# Altium footprint library ESKDPcbLib.PcbLib: 608 footprints (part 4 of 38)
Each footprint in its own frame and in the unit in brackets; x right, y up, seen from the top. Pads: shape width x height; smd on the part's side, far side on the other; paste and mask are expansions set on the pad; w line width, h text height; cw(c..) or ccw(c..) is an arc to the next point about the centre after c.
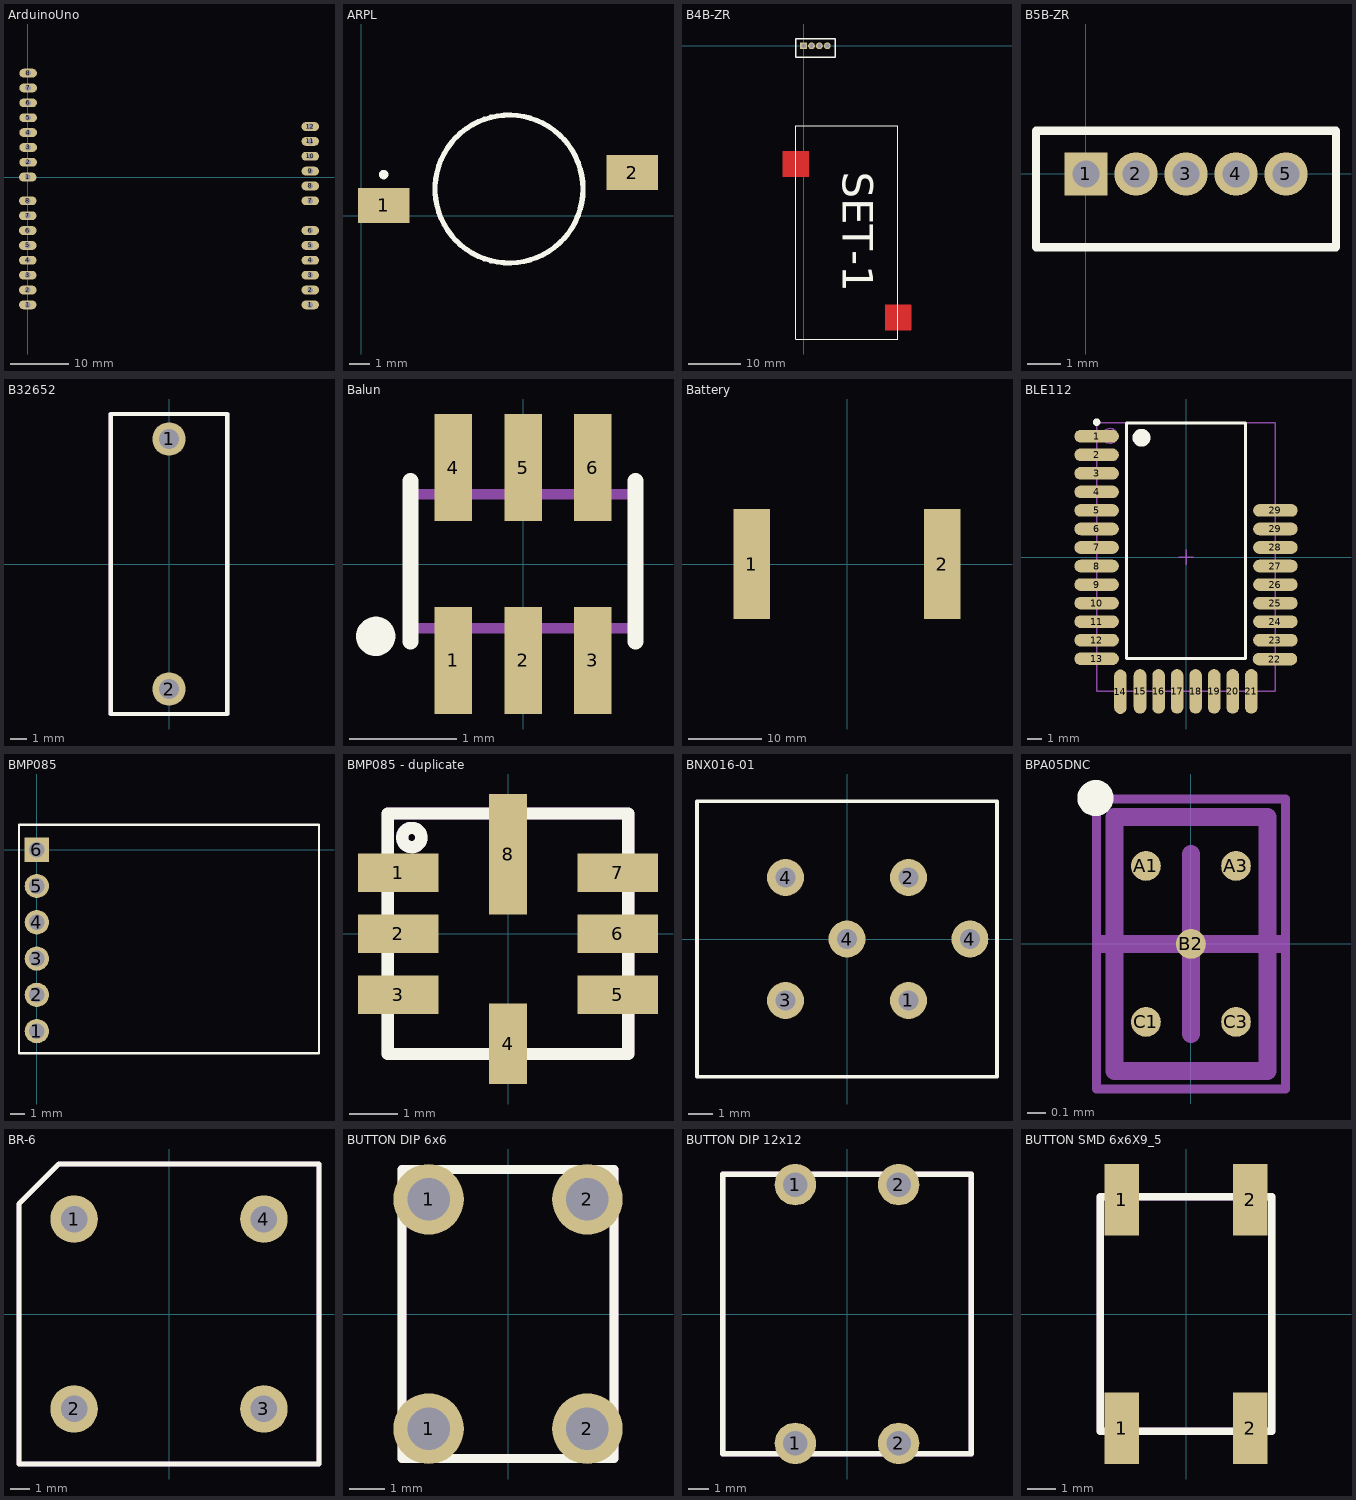
[diagram p3: the footprints below, top view; thin cyan lines are the x and y axes]

## ArduinoUno [mm]
pads (28):
  oval 3x1.5 hole 1: 1(0,-21.84) 1(0,0) 1(48.26,-21.84) 2(0,-19.3) 2(0.06,2.525) 2(48.26,-19.3) 3(0,-16.76) 3(0.06,5.065) 3(48.26,-16.76) 4(0,-14.22) 4(0.06,7.605) 4(48.26,-14.22) 5(0,-11.68) 5(0.06,10.145) 5(48.26,-11.68) 6(0,-9.14) 6(0.06,12.685) 6(48.26,-9.14) 7(0,-6.6) 7(0.06,15.225) 7(48.26,-4.06) 8(0,-4.06) 8(0.06,17.765) 8(48.26,-1.52) 9(48.26,1.02) 10(48.26,3.56) 11(48.26,6.1) 12(48.26,8.64)

## ARPL [mm]
pads (2):
  rect 2.5x1.7 smd: 1(1.1,0.5) 2(13.2,2.1)
Top Overlay:
  circle w0.254: c7.2,1.3 r3.6
  circle w0.254: c1.1,2 r0.1

## B4B-ZR [mm]
pads (4):
  rect 1.3x1.3 hole 0.8 mask+0: 1(0,0)
  round 1.3 hole 0.8 mask+0: 2(1.5,0) 3(3,0) 4(4.5,0)
Top Layer:
  rectangle: 15.5,-54.2 20.5,-49.2
  rectangle: -4,-25 1,-20
Top Overlay:
  lines w0.15: -1.5,-55.8 -1.5,-15.2 17.9,-15.2 17.9,-55.8 -1.5,-55.8
  lines w0.254: -1.5,-2.2 -1.5,1.3 6,1.3 6,-2.2 -1.5,-2.2
  text "SET-1" at 5.5,-24 h10
3D body: height 5.9, standoff 0, extent -1.5,-55.8 17.9,-15.2
3D body: height 4.5, standoff -2.7, extent -1.55,-2.15 5.95,1.35

## B5B-ZR [mm]
pads (5):
  rect 1.3x1.3 hole 0.8 mask+0: 1(0,0)
  round 1.3 hole 0.8 mask+0: 2(1.5,0) 3(3,0) 4(4.5,0) 5(6,0)
Top Overlay:
  lines w0.254: -1.5,-2.2 -1.5,1.3 7.5,1.3 7.5,-2.2 -1.5,-2.2
3D body: height 4.5, standoff -2.7, extent -1.5,-2.15 7.5,1.35

## B32652 [mm]
pads (2):
  round 2 hole 1.2: 1(0,7.5) 2(0,-7.5)
Top Overlay:
  lines w0.254: -3.5,-9 -3.5,9 3.5,9 3.5,-9 -3.5,-9
Mechanical 7:
  lines w0.254: -3.5,-9 -3.5,9 3.5,9 3.5,-9 -3.5,-9
Mechanical 10:
  text ".Comment" at 4.2,1.7 h2
  text ".Designator" at 4.2,3.3 h2
3D body: height 12.5, standoff 0, extent -3.5,-9 3.5,9

## Balun [mm]
height 0.7
pads (6):
  rect 0.35x1 smd: 1(-0.65,-0.9) 2(0,-0.9) 3(0.65,-0.9) 4(-0.65,0.9) 5(0,0.9) 6(0.65,0.9)
Top Overlay:
  circle w0.254: c-1.375,-0.675 r0.056
  lines w0.15: -1.05,-0.725 -1.05,0.775 ; 1.05,-0.725 1.05,0.775
Mechanical 7:
  lines w0.1: -1.05,-0.6 1.05,-0.6 1.05,0.65 -1.05,0.65 -1.05,-0.6
Mechanical 10:
  text ".Designator" at -1.8,1.775 h0.8
  text ".Comment" at -0.925,-2.05 h0.6
3D body: height 0.55, standoff 0, extent -1.05,-0.6 1.05,0.65

## Battery [mm]
pads (2):
  rect 5x15 smd mask+0: 1(-13,0) 2(13,0)

## BLE112 [mm] "Module,28-Leads, Body 18,10x8,66mm, Pitch 1,25mm"
height 2.3
pads (30):
  oval 3x0.85 smd: 1(-6.025,8.15) 2(-6.025,6.9) 3(-6.025,5.65) 4(-6.025,4.4) 5(-6.025,3.15) 6(-6.025,1.9) 7(-6.025,0.65) 8(-6.025,-0.6) 9(-6.025,-1.85) 10(-6.025,-3.1) 11(-6.025,-4.35) 12(-6.025,-5.6) 13(-6.025,-6.85) 22(6,-6.875) 23(6.025,-5.6) 24(6.025,-4.35) 25(6.025,-3.1) 26(6.025,-1.85) 27(6.025,-0.6) 28(6.025,0.65) 29(6.025,1.9) 29(6.025,3.15)
  oval 0.85x3 smd: 14(-4.425,-9.075) 15(-3.1,-9.05) 16(-1.85,-9.05) 17(-0.6,-9.05) 18(0.65,-9.05) 19(1.9,-9.05) 20(3.15,-9.05) 21(4.4,-9.05)
Top Overlay:
  circle w0.25: c-6.025,9.1 r0.125
  circle w0.6: c-3,8.05 r0.3
  lines w0.2: -4,-6.825 -4,9.05 4,9.05 4,-6.825 -4,-6.825
Mechanical 7:
  lines w0.05: -6.025,-9.05 -6.025,9.05 6.025,9.05 6.025,-9.05 -6.025,-9.05
  lines w0.1: -0.5,0 0.5,0 ; 0,-0.5 0,0.5
Mechanical 9:
  circle w0.1: c-5.125,8.175 r0.5
  lines w0.1: -6.025,-9.05 -6.025,9.05 6.025,9.05 6.025,-9.05 -6.025,-9.05
3D body: height 2.3, standoff 0, extent -6.025,-9.05 6.025,9.05

## BMP085 [mm]
pads (6):
  round 1.7 hole 1.1: 1(0,-12.7) 2(0,-10.16) 3(0,-7.62) 4(0,-5.08) 5(0,-2.54)
  rect 1.7x1.7 hole 1.1: 6(0,0)
Top Overlay:
  lines w0.15: -1.25,-14.25 -1.25,1.75 19.75,1.75 19.75,-14.25 -1.25,-14.25
Mechanical 7:
  lines w0.1: -1.25,-14.25 -1.25,1.75 19.75,1.75 19.75,-14.25 -1.25,-14.25

## BMP085 - duplicate [mm]
pads (8):
  rect 1.67x0.8 smd: 1(-2.282,1.27) 2(-2.282,0) 3(-2.282,-1.27) 5(2.282,-1.27) 6(2.282,0) 7(2.282,1.27)
  rect 0.8x1.67 smd: 4(0,-2.282)
  rect 0.8x2.5 smd: 8(0,1.65)
Top Overlay:
  circle w0.254: c-2,2 r0.2
  lines w0.254: -2.5,-2.5 -2.5,2.5 2.5,2.5 2.5,-2.5 -2.5,-2.5
Mechanical 7:
  circle w0.254: c-2,2 r0.2
  lines w0.254: -2.5,-2.5 -2.5,2.5 2.5,2.5 2.5,-2.5 -2.5,-2.5
Mechanical 10:
  text ".Comment" at 3.81,2.54 h1.52
  text ".Designator" at 3.81,1.27 h1.52
3D body: height 1.25, standoff 0.04, extent -2.46,-2.5 2.54,2.5

## BNX016-01 [mm] "12x11x8"
height 8
pads (6):
  round 1.5 hole 0.8: 1(2.5,-2.5) 2(2.5,2.5) 3(-2.5,-2.5) 4(-2.5,2.5) 4(0,0) 4(5,0)
Top Overlay:
  lines w0.15: -6.1,-5.6 -6.1,5.6 6.1,5.6 6.1,-5.6 -6.1,-5.6
Mechanical 7:
  lines w0.1: -6.1,-5.6 6.1,-5.6 6.1,5.6 -6.1,5.6 -6.1,-5.6
3D body: height 2, standoff -2, extent -2.75,-2.8 -2.225,-2.2
3D body: height 2, standoff -2, extent 2.25,-2.8 2.775,-2.2
3D body: height 2, standoff -2, extent 4.75,-0.3 5.275,0.3
3D body: height 2, standoff -2, extent -0.25,-0.3 0.275,0.3
3D body: height 2, standoff -2, extent -2.75,2.2 -2.225,2.8
3D body: height 2, standoff -2, extent 2.25,2.2 2.775,2.8
3D body: height 8, standoff 0, extent -6,-5.5 6,5.5

## BPA05DNC [mm] "Micro SMD, 5-Leads, Body 1.41x0.85mm, Pitch 0.5mm, NSC Recommended"
height 1
pads (5):
  round 0.165 smd paste-0.082 mask+0.05: A1(-0.25,0.433) A3(0.25,0.433) B2(0,0) C1(-0.25,-0.433) C3(0.25,-0.433)
Top Overlay:
  circle w0.1: c-0.53,0.81 r0.05
Top Paste:
  circle w0.05: c0.15,-0.533 r0.025
  circle w0.05: c0.35,-0.333 r0.025
  circle w0.05: c0.15,-0.333 r0.025
  circle w0.05: c0.35,-0.533 r0.025
  circle w0.05: c-0.35,-0.533 r0.025
  circle w0.05: c-0.15,-0.333 r0.025
  circle w0.05: c-0.35,-0.333 r0.025
  circle w0.05: c-0.15,-0.533 r0.025
  circle w0.05: c0.15,0.333 r0.025
  circle w0.05: c0.35,0.533 r0.025
  circle w0.05: c0.15,0.533 r0.025
  circle w0.05: c0.35,0.333 r0.025
  circle w0.05: c-0.35,0.333 r0.025
  circle w0.05: c-0.15,0.533 r0.025
  circle w0.05: c-0.35,0.533 r0.025
  circle w0.05: c-0.15,0.333 r0.025
  circle w0.05: c-0.1,-0.1 r0.025
  circle w0.05: c0.1,0.1 r0.025
  circle w0.05: c-0.1,0.1 r0.025
  circle w0.05: c0.1,-0.1 r0.025
  region: 0.35,-0.533 0.15,-0.533 0.15,-0.583 0.35,-0.583
  rectangle: 0.15,-0.533 0.35,-0.333
  rectangle: 0.15,-0.333 0.35,-0.283
  region: 0.15,-0.533 0.15,-0.333 0.1,-0.333 0.1,-0.533
  region: 0.35,-0.333 0.35,-0.533 0.4,-0.533 0.4,-0.333
  region: -0.15,-0.533 -0.35,-0.533 -0.35,-0.583 -0.15,-0.583
  rectangle: -0.35,-0.533 -0.15,-0.333
  rectangle: -0.35,-0.333 -0.15,-0.283
  region: -0.35,-0.533 -0.35,-0.333 -0.4,-0.333 -0.4,-0.533
  region: -0.15,-0.333 -0.15,-0.533 -0.1,-0.533 -0.1,-0.333
  region: 0.35,0.333 0.15,0.333 0.15,0.283 0.35,0.283
  rectangle: 0.15,0.333 0.35,0.533
  rectangle: 0.15,0.533 0.35,0.583
  region: 0.15,0.333 0.15,0.533 0.1,0.533 0.1,0.333
  region: 0.35,0.533 0.35,0.333 0.4,0.333 0.4,0.533
  region: -0.15,0.333 -0.35,0.333 -0.35,0.283 -0.15,0.283
  rectangle: -0.35,0.333 -0.15,0.533
  rectangle: -0.35,0.533 -0.15,0.583
  region: -0.35,0.333 -0.35,0.533 -0.4,0.533 -0.4,0.333
  region: -0.15,0.533 -0.15,0.333 -0.1,0.333 -0.1,0.533
  region: 0.1,-0.1 -0.1,-0.1 -0.1,-0.15 0.1,-0.15
  rectangle: -0.1,-0.1 0.1,0.1
  rectangle: -0.1,0.1 0.1,0.15
  region: -0.1,-0.1 -0.1,0.1 -0.15,0.1 -0.15,-0.1
  region: 0.1,0.1 0.1,-0.1 0.15,-0.1 0.15,0.1
Mechanical 13:
  lines w0.1: -0.425,-0.705 0.425,-0.705 0.425,0.705 -0.425,0.705 -0.425,-0.705
Mechanical 15:
  lines w0.05: -0.525,-0.805 -0.525,0.805 0.525,0.805 0.525,-0.805 -0.525,-0.805
  lines w0.1: -0.5,0 0.5,0 ; 0,-0.5 0,0.5
3D body: height 1, standoff 0, extent -0.424,-0.704 0.424,0.704

## BR-6 [mm]
pads (4):
  round 2.5 hole 1.4: 1(-5,5) 2(-5,-5) 3(5,-5) 4(5,5)
Top Overlay:
  lines w0.254: -7.9,-7.9 -7.9,5.8 -5.8,7.9 7.9,7.9 7.9,-7.9 -7.9,-7.9
Mechanical 7:
  lines w0.254: -7.9,-7.9 -7.9,5.8 -5.8,7.9 7.9,7.9 7.9,-7.9 -7.9,-7.9
Mechanical 10:
  text ".Designator" at -4.1,12 h1.52
  text ".Comment" at -3.9,8.7 h1.52
3D body "KBPC1-KBPC6_br-6.STEP": height 5.33, standoff -15, extent -7.875,-7.875 7.875,7.875

## BUTTON DIP 6x6 [mm]
pads (4):
  round 2 hole 1.2: 1(-2.25,-3.25) 1(-2.25,3.25) 2(2.25,-3.25) 2(2.25,3.25)
Top Overlay:
  lines w0.254: -3,-4.1 3,-4.1 3,4.1 -3,4.1 -3,-4.1
Mechanical 7:
  lines w0.254: -3,-4.1 -3,4.1 3,4.1 3,-4.1 -3,-4.1
Mechanical 10:
  text ".Designator" at -0.225,5.65 h1
  text ".Comment" at -0.225,4.65 h1
3D body "button 6x6.STEP": height 9.5, standoff -3.5, extent -3,-4.106 3,4.106

## BUTTON DIP 12x12 [mm]
pads (4):
  round 2 hole 1.2: 1(-2.5,-6.25) 1(-2.5,6.25) 2(2.5,-6.25) 2(2.5,6.25)
Top Overlay:
  lines w0.254: -6,-6.75 6,-6.75 6,6.75 -6,6.75 -6,-6.75
Mechanical 7:
  lines w0.254: -6,-6.75 -6,6.75 6,6.75 6,-6.75 -6,-6.75
Mechanical 10:
  text ".Designator" at -6,9 h1
  text ".Comment" at -6,8 h1
3D body "SWT_12x12x18.STEP": height 17.7, standoff -2.8, extent -6,-6.725 6,6.725

## BUTTON SMD 6x6X9_5 [mm]
pads (4):
  rect 1.2x2.5 smd: 1(-2.25,-4) 1(-2.25,4) 2(2.25,-4) 2(2.25,4)
Top Overlay:
  lines w0.254: -3,-4.1 -3,4.1 3,4.1 3,-4.1 -3,-4.1
Mechanical 7:
  lines w0.254: -3,-4.1 3,-4.1 3,4.1 -3,4.1 -3,-4.1
Mechanical 10:
  text ".Comment" at -0.225,4.65 h1
  text ".Designator" at -0.225,5.65 h1
3D body "button smd 6x6x9_5.STEP": height 9.5, standoff 0, extent -3,-4.5 3,4.5